# Altium footprint library 集大电协1.2.PcbLib: 175 footprints (part 5 of 11)
Each footprint in its own frame and in the unit in brackets; x right, y up, seen from the top. Pads: shape width x height; smd on the part's side, far side on the other; paste and mask are expansions set on the pad; w line width, h text height; cw(c..) or ccw(c..) is an arc to the next point about the centre after c.
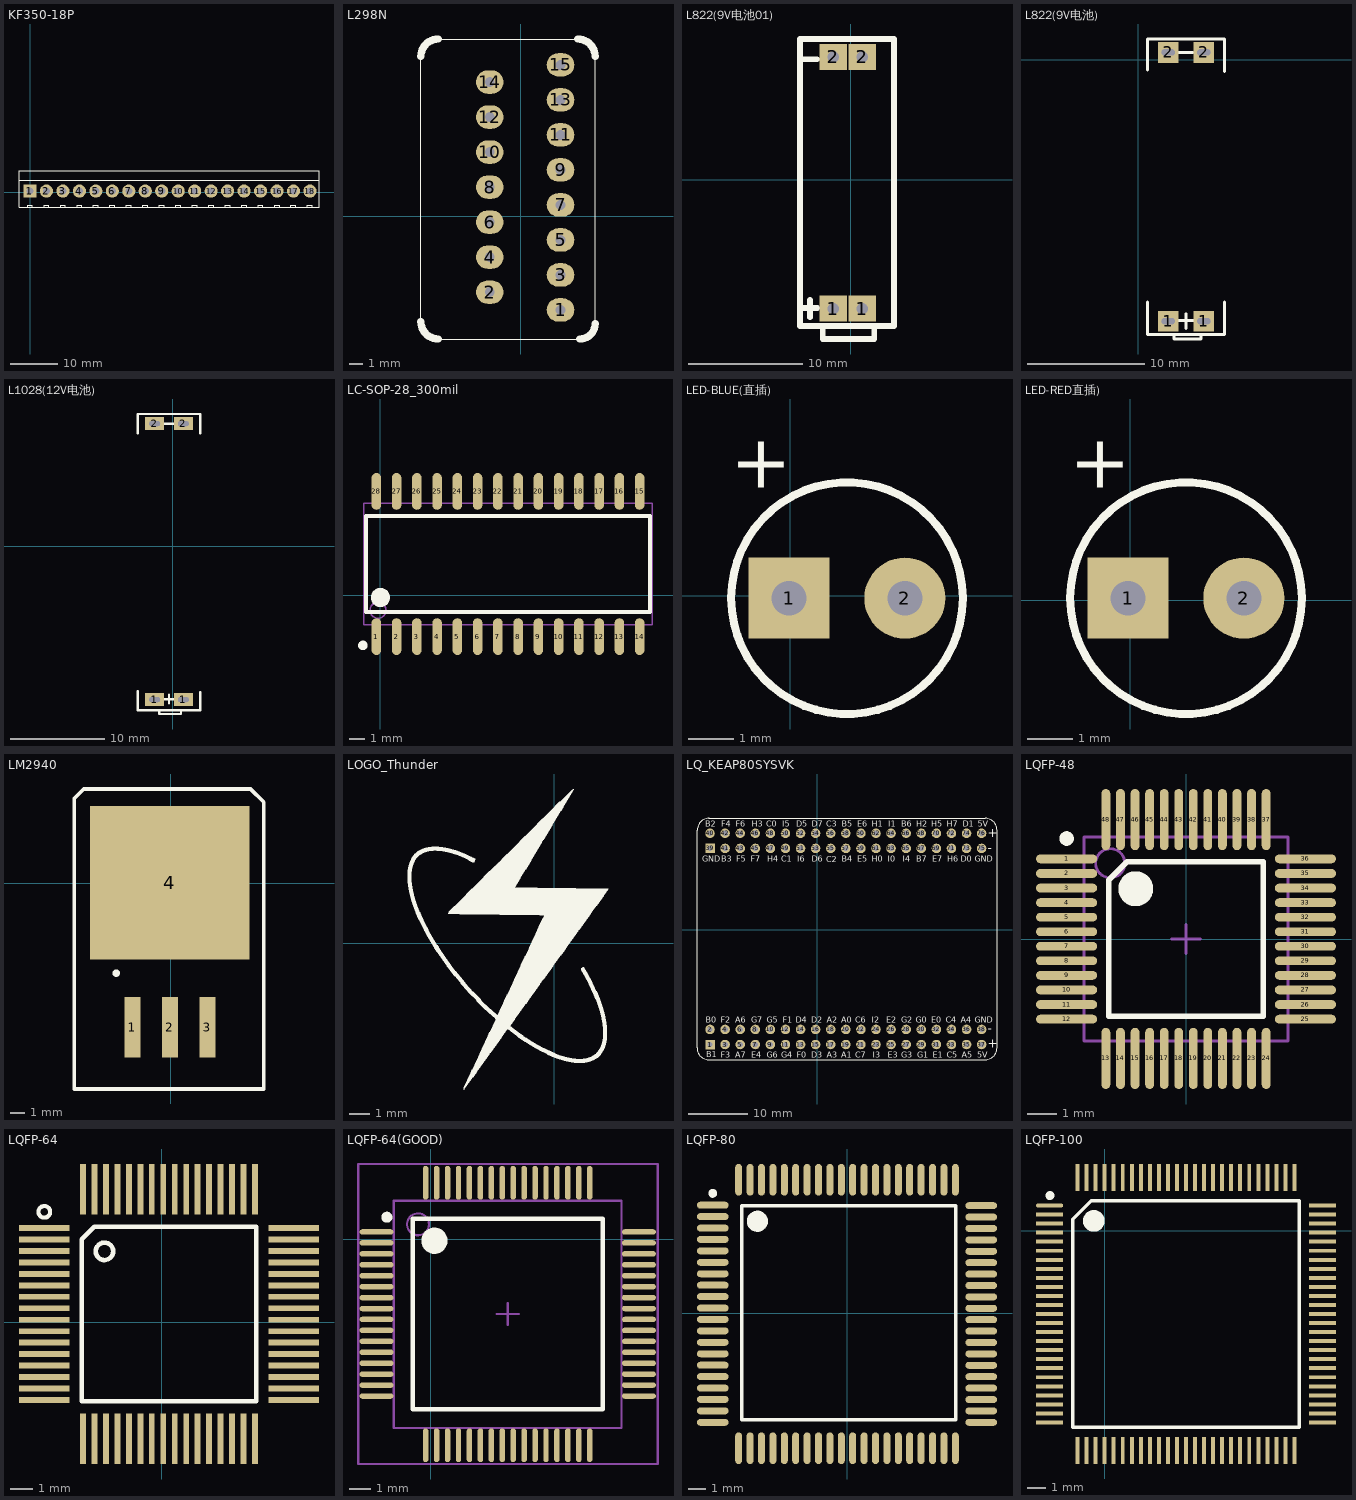
[diagram p4: the footprints below, top view; thin cyan lines are the x and y axes]

## KF350-18P [mil]
pads (18):
  rect 110x110 hole 59.06: 1(-1.14,8.5)
  round 110 hole 59.06: 2(136.65,8.5) 3(274.45,8.51) 4(412.25,8.51) 5(550.04,8.51) 6(687.84,8.51) 7(825.63,8.5) 8(963.43,8.5) 9(1101.22,8.5) 10(1239.02,8.5) 11(1376.81,8.5) 12(1514.61,8.5) 13(1652.4,8.5) 14(1790.2,8.5) 15(1927.99,8.5) 16(2065.99,8.5) 17(2203.74,8.5) 18(2341.54,8.5)
Top Overlay:
  lines w10: -93.14,100.5 1039.86,100.5 1176.14,100.5 ; -21.14,-128.5 -21.14,-111.5 18.86,-111.5 18.86,-128.5 ; 116.65,-128.5 116.65,-111.5 156.65,-111.5 156.65,-128.5 ; 254.45,-128.49 254.45,-111.5 294.45,-111.5 294.45,-128.49 ; 392.25,-128.49 392.25,-111.5 432.25,-111.5 432.25,-128.49 ; 530.04,-128.49 530.04,-111.5 570.04,-111.5 570.04,-128.49 ; 667.86,-128.5 667.86,-111.5 707.86,-111.5 707.86,-128.5 ; 805.86,-128.5 805.86,-111.5 845.86,-111.5 845.86,-128.5 ; 943.86,-128.5 943.86,-111.5 983.86,-111.5 983.86,-128.5 ; 1081.65,-128.5 1081.65,-111.5 1121.65,-111.5 1121.65,-128.5 ; 1177.65,100.5 1313.94,100.5 ; 1219.45,-128.5 1219.45,-111.5 1259.45,-111.5 1259.45,-128.5 ; 1315.45,100.5 1451.73,100.5 ; 1357.25,-128.5 1357.25,-111.5 1397.25,-111.5 1397.25,-128.5 ; 1453.25,100.5 1589.53,100.5 ; 1495.04,-128.5 1495.04,-111.5 1535.04,-111.5 1535.04,-128.5 ; 1591.04,100.5 1727.32,100.5 ; 1632.84,-128.5 1632.84,-111.5 1672.84,-111.5 1672.84,-128.5 ; 1728.84,100.5 1865.12,100.5 ; 1770.63,-128.5 1770.63,-111.5 1810.63,-111.5 1810.63,-128.5 ; 1866.63,100.5 2002.91,100.5 ; 1908.43,-128.5 1908.43,-111.5 1948.43,-111.5 1948.43,-128.5 ; 1996.63,100.5 2416.34,100.39 ; 2046.43,-128.5 2046.43,-111.5 ; 2047.43,-111.5 2087.43,-111.5 2087.43,-128.5 ; 2181.27,-126.53 2181.27,-109.53 ; 2182.27,-109.53 2222.27,-109.53 2222.27,-126.53 ; 2319.06,-127.51 2319.06,-110.51 ; 2320.06,-110.51 2360.06,-110.51 2360.06,-127.51 ; -93.14,-128.5 1039.86,-128.5 1177.65,-128.5 1315.45,-128.5 1453.25,-128.5 1591.04,-128.5 1728.84,-128.5 1866.63,-128.5 2417.32,-128.5 2417.32,180.5 1866.63,180.5 1728.84,180.5 1591.04,180.5 1453.25,180.5 1315.45,180.5 1177.65,180.5 1039.86,180.5 -93.14,180.5 -93.14,-128.5
3D body: height 393.7, standoff -149.61, extent -85.68,-123.13 67.86,172.14
3D body: height 393.7, standoff -149.61, extent 52.11,-123.13 205.65,172.14
3D body: height 393.7, standoff -149.61, extent 189.91,-123.13 343.45,172.14
3D body: height 393.7, standoff -149.61, extent 603.3,-123.13 756.84,172.14
3D body: height 393.7, standoff -149.61, extent 465.5,-123.13 619.04,172.14
3D body: height 393.7, standoff -149.61, extent 327.7,-123.13 481.24,172.14
3D body: height 393.7, standoff -149.61, extent 1016.68,-123.13 1170.22,172.14
3D body: height 393.7, standoff -149.61, extent 878.88,-123.14 1032.42,172.14
3D body: height 393.7, standoff -149.61, extent 741.08,-123.14 894.63,172.14
3D body: height 393.7, standoff -149.61, extent 1430.07,-123.13 1583.61,172.14
3D body: height 393.7, standoff -149.61, extent 1292.27,-123.14 1445.81,172.14
3D body: height 393.7, standoff -149.61, extent 1154.47,-123.14 1308.01,172.14
3D body: height 393.7, standoff -149.61, extent 1843.45,-123.13 1996.99,172.14
3D body: height 393.7, standoff -149.61, extent 1705.65,-123.14 1859.19,172.14
3D body: height 393.7, standoff -149.61, extent 1567.86,-123.14 1721.4,172.14
3D body: height 393.7, standoff -149.61, extent 1981.3,-123.14 2134.84,172.14
3D body: height 393.7, standoff -149.61, extent 2119.09,-123.03 2272.64,172.24
3D body: height 393.7, standoff -149.61, extent 2255.91,-123.14 2409.45,172.14

## L298N [mm]
pads (15):
  oval 2x1.7 hole 0.712: 1(2.87,-6.807) 2(-2.261,-5.512) 3(2.87,-4.267) 4(-2.261,-2.972) 5(2.87,-1.727) 6(-2.261,-0.432) 7(2.87,0.813) 8(-2.261,2.108) 9(2.87,3.353) 10(-2.261,4.648) 11(2.87,5.893) 12(-2.261,7.188) 13(2.87,8.433) 14(-2.261,9.728) 15(2.87,10.973)
Top Overlay:
  lines w0.076: -7.264,-7.645 -7.264,11.582 ; -5.994,-8.915 4.267,-8.915 ; -5.994,12.852 4.115,12.852 ; 5.385,-7.925 5.385,11.582
  lines w0.54: -7.264,-7.645 ccw(c-5.994,-7.645) -5.994,-8.915 ; -7.264,11.582 cw(c-5.994,11.582) -5.994,12.852 ; 4.115,12.852 cw(c4.115,11.582) 5.385,11.582 ; 4.267,-8.915 ccw(c4.267,-7.798) 5.385,-7.798
3D body "User Library-Multiwatt15V.STEP": height 21.3, standoff -1, extent -6.883,-7.666 3.007,11.934

## L822(9V电池01) [mil]
pads (4):
  rect 95x90 hole 40: 1(-60,-445) 1(40,-445) 2(-60,423) 2(40,423)
Top Overlay:
  lines w20: -165,-442.72 -115,-442.72 ; -165,415 -115.94,415 ; -140.63,-475 -140.63,-415 ; -95.94,-510.51 -95.94,-549.88 81.22,-549.88 81.22,-510.51 ; -175,-505 -175,-145.55 -175,485 150,485 150,-505 -175,-505

## L822(9V电池) [mil]
pads (4):
  rect 70x70 hole 20 slot 45 at 0 deg: 1(100,-880) 1(220,-880) 2(100,25) 2(220,25)
Top Overlay:
  lines w10: 30,-815 30,-925 290,-925 290,-815 ; 30,-35 30,70 290,70 290,-40 ; 120,-930 120,-940 210,-940 210,-930 ; 135,25 184.06,25 ; 135.63,-877.72 185.63,-877.72 ; 160,-905 160,-855

## L1028(12V电池) [mil]
pads (4):
  rect 80x55 hole 20 slot 45 at 0 deg: 1(-75,-640) 1(45,-640) 2(-75,510) 2(45,510)
Top Overlay:
  lines w10: -145,-605 -145,-685 115,-685 115,-610 ; -145,470 -145,550 115,550 115,470 ; -55,-690 -55,-700 35,-700 35,-690 ; -40,510 9.06,510 ; -39.37,-637.72 10.63,-637.72 ; -15,-655 -15,-620

## LC-SOP-28_300mil [mm]
pads (28):
  oval 0.6x2.3 smd: 1(-0.255,-2.575) 2(1.015,-2.575) 3(2.285,-2.575) 4(3.555,-2.575) 5(4.825,-2.575) 6(6.095,-2.575) 7(7.365,-2.575) 8(8.635,-2.575) 9(9.905,-2.575) 10(11.175,-2.575) 11(12.445,-2.575) 12(13.715,-2.575) 13(14.985,-2.575) 14(16.255,-2.575) 15(16.255,6.525) 16(14.985,6.525) 17(13.715,6.525) 18(12.445,6.525) 19(11.175,6.525) 20(9.905,6.525) 21(8.635,6.525) 22(7.365,6.525) 23(6.095,6.525) 24(4.825,6.525) 25(3.555,6.525) 26(2.285,6.525) 27(1.015,6.525) 28(-0.255,6.525)
Top Overlay:
  circle w0.3: c-1.1,-3.125 r0.15
  circle w0.6: c0,-0.125 r0.3
  lines w0.254: -0.9,-1.025 -0.9,4.975 16.9,4.975 16.9,-1.025 -0.9,-1.025
Mechanical 13:
  circle w0.1: c-0.15,-0.925 r0.5
  lines w0.1: -1.05,-1.825 -1.05,5.775 17.05,5.775 17.05,-1.825 -1.05,-1.825

## LED-BLUE(直插) [mil]
pads (2):
  rect 70x70 hole 30: 1(-0.98,-1.97)
  round 70 hole 30: 2(99.02,-1.97)
Top Overlay:
  circle w7: c49.02,-1.97 r100
  text "+" at 1.39,78.32 h78.74
3D body: height 204.72, standoff -78.74, extent -21.65,-79.72 116.93,77.76

## LED-RED直插) [mil]
pads (2):
  rect 70x70 hole 30: 1(-1.97,1.97)
  round 70 hole 30: 2(98.03,1.97)
Top Overlay:
  circle w7: c48.03,1.97 r100
  text "+" at 0.41,82.26 h78.74
3D body: height 204.72, standoff -78.74, extent -19.68,-76.76 118.9,80.71

## LM2940 [mm]
pads (4):
  rect 1.1x4.1 smd: 1(-2.591,-9.732) 2(-0.051,-9.732) 3(2.489,-9.732)
  rect 10.8x10.41 smd: 4(-0.051,0.047)
Top Overlay:
  circle w0.25: c-3.691,-6.076 r0.125
  lines w0.254: -6.528,-13.923 -6.528,5.762 -5.893,6.397 5.41,6.397 6.299,5.508 6.299,-13.923 -6.528,-13.923
3D body: height 5, standoff 0, extent -6.2,-5.2 6,6.2

## LOGO_Thunder [mm]
Top Overlay:
  drawing of 2284 lines, arcs and shapes, not listed

## LQ_KEAP80SYSVK [mm]
pads (76):
  rect 1.6x1.6 hole 0.9: 1(-18.016,-19.342) 39(-18.016,13.678)
  round 1.6 hole 0.9: 2(-18.016,-16.802) 3(-15.476,-19.342) 4(-15.476,-16.802) 5(-12.936,-19.342) 6(-12.936,-16.802) 7(-10.396,-19.342) 8(-10.396,-16.802) 9(-7.856,-19.342) 10(-7.856,-16.802) 11(-5.316,-19.342) 12(-5.316,-16.802) 13(-2.776,-19.342) 14(-2.776,-16.802) 15(-0.236,-19.342) 16(-0.236,-16.802) 17(2.304,-19.342) 18(2.304,-16.802) 19(4.844,-19.342) 20(4.844,-16.802) 21(7.384,-19.342) 22(7.384,-16.802) 23(9.924,-19.342) 24(9.924,-16.802) 25(12.464,-19.342) 26(12.464,-16.802) 27(15.004,-19.342) 28(15.004,-16.802) 29(17.544,-19.342) 30(17.544,-16.802) 31(20.084,-19.342) 32(20.084,-16.802) 33(22.624,-19.342) 34(22.624,-16.802) 35(25.164,-19.342) 36(25.164,-16.802) 37(27.704,-19.342) 38(27.704,-16.802) 40(-18.016,16.218) 41(-15.476,13.678) 42(-15.476,16.218) 43(-12.936,13.678) 44(-12.936,16.218) 45(-10.396,13.678) 46(-10.396,16.218) 47(-7.856,13.678) 48(-7.856,16.218) 49(-5.316,13.678) 50(-5.316,16.218) 51(-2.776,13.678) 52(-2.776,16.218) 53(-0.236,13.678) 54(-0.236,16.218) 55(2.304,13.678) 56(2.304,16.218) 57(4.844,13.678) 58(4.844,16.218) 59(7.384,13.678) 60(7.384,16.218) 61(9.924,13.678) 62(9.924,16.218) 63(12.464,13.678) 64(12.464,16.218) 65(15.004,13.678) 66(15.004,16.218) 67(17.544,13.678) 68(17.544,16.218) 69(20.084,13.678) 70(20.084,16.218) 71(22.624,13.678) 72(22.624,16.218) 73(25.164,13.678) 74(25.164,16.218) 75(27.704,13.678) 76(27.704,16.218)
Top Overlay:
  lines w0.2: -20.208,16.739 -20.208,-19.905 ccw(c-18.208,-19.905) -18.208,-21.905 28.292,-21.905 ccw(c28.292,-19.905) 30.292,-19.905 30.292,16.739 ccw(c28.292,16.739) 28.292,18.739 -18.208,18.739 ; -20.158,16.749 cw(c-18.158,16.749) -18.158,18.749
  text "-" at 28.752,13.039 h1.5
  text "+" at 28.742,-19.901 h1.5
  text "-" at 28.752,-17.401 h1.5
  text "+" at 28.762,15.579 h1.5
  text "C3" at 1.522,17.289 h1
  text "H2" at 16.702,17.289 h1
  text "5V" at 26.992,-21.561 h1
  text "A5" at 24.322,-21.561 h1
  text "C5" at 21.822,-21.561 h1
  text "E1" at 19.482,-21.551 h1
  text "G1" at 16.902,-21.561 h1
  text "G3" at 14.132,-21.561 h1
  text "E3" at 11.882,-21.551 h1
  text "I3" at 9.352,-21.561 h1
  text "C7" at 6.472,-21.561 h1
  text "A1" at 4.082,-21.561 h1
  text "A3" at 1.602,-21.561 h1
  text "D3" at -0.938,-21.561 h1
  text "F0" at -3.428,-21.561 h1
  text "G4" at -6.068,-21.561 h1
  text "G6" at -8.488,-21.561 h1
  text "E4" at -11.048,-21.561 h1
  text "A7" at -13.768,-21.561 h1
  text "F3" at -16.208,-21.561 h1
  text "GND" at 26.532,-15.641 h1
  text "A4" at 24.212,-15.641 h1
  text "C4" at 21.652,-15.641 h1
  text "E0" at 19.192,-15.641 h1
  text "G0" at 16.642,-15.641 h1
  text "G2" at 14.132,-15.641 h1
  text "E2" at 11.642,-15.641 h1
  text "I2" at 9.212,-15.641 h1
  text "C6" at 6.472,-15.641 h1
  text "A0" at 4.082,-15.641 h1
  text "A2" at 1.602,-15.641 h1
  text "D2" at -0.938,-15.641 h1
  text "D4" at -3.548,-15.641 h1
  text "F1" at -5.798,-15.641 h1
  text "G5" at -8.488,-15.641 h1
  text "G7" at -11.048,-15.641 h1
  text "A6" at -13.768,-15.641 h1
  text "F2" at -16.208,-15.641 h1
  text "B0" at -18.758,-15.641 h1
  text "GND" at 26.512,11.399 h1
  text "D0" at 24.192,11.399 h1
  text "H6" at 21.952,11.399 h1
  text "E7" at 19.392,11.389 h1
  text "B7" at 16.722,11.399 h1
  text "I4" at 14.442,11.389 h1
  text "I0" at 11.872,11.389 h1
  text "H0" at 9.222,11.399 h1
  text "E5" at 6.772,11.389 h1
  text "B4" at 4.162,11.399 h1
  text "C2" at 1.552,11.379 h1
  text "D6" at -0.858,11.399 h1
  text "I6" at -3.308,11.429 h1
  text "C1" at -5.988,11.399 h1
  text "H4" at -8.408,11.399 h1
  text "F7" at -11.138,11.389 h1
  text "F5" at -13.568,11.389 h1
  text "B3" at -16.128,11.399 h1
  text "GND" at -19.328,11.429 h1
  text "5V" at 27.052,17.289 h1
  text "D1" at 24.532,17.289 h1
  text "H7" at 21.872,17.289 h1
  text "H5" at 19.252,17.289 h1
  text "B6" at 14.192,17.289 h1
  text "I1" at 11.962,17.289 h1
  text "H1" at 9.232,17.289 h1
  text "E6" at 6.772,17.289 h1
  text "B5" at 4.142,17.289 h1
  text "D7" at -0.878,17.289 h1
  text "D5" at -3.488,17.289 h1
  text "I5" at -5.878,17.319 h1
  text "C0" at -8.568,17.289 h1
  text "H3" at -10.988,17.289 h1
  text "F6" at -13.708,17.289 h1
  text "F4" at -16.148,17.289 h1
  text "B2" at -18.788,17.289 h1
  text "B1" at -18.618,-21.521 h1

## LQFP-48 [mm]
pads (48):
  oval 2.1x0.3 smd: 1(-4.1,2.75) 2(-4.1,2.25) 3(-4.1,1.75) 4(-4.1,1.25) 5(-4.1,0.75) 6(-4.1,0.25) 7(-4.1,-0.25) 8(-4.1,-0.75) 9(-4.1,-1.25) 10(-4.1,-1.75) 11(-4.1,-2.25) 12(-4.1,-2.75) 25(4.1,-2.75) 26(4.1,-2.25) 27(4.1,-1.75) 28(4.1,-1.25) 29(4.1,-0.75) 30(4.1,-0.25) 31(4.1,0.25) 32(4.1,0.75) 33(4.1,1.25) 34(4.1,1.75) 35(4.1,2.25) 36(4.1,2.75)
  oval 0.3x2.1 smd: 13(-2.75,-4.1) 14(-2.25,-4.1) 15(-1.75,-4.1) 16(-1.25,-4.1) 17(-0.75,-4.1) 18(-0.25,-4.1) 19(0.25,-4.1) 20(0.75,-4.1) 21(1.25,-4.1) 22(1.75,-4.1) 23(2.25,-4.1) 24(2.75,-4.1) 37(2.75,4.1) 38(2.25,4.1) 39(1.75,4.1) 40(1.25,4.1) 41(0.75,4.1) 42(0.25,4.1) 43(-0.25,4.1) 44(-0.75,4.1) 45(-1.25,4.1) 46(-1.75,4.1) 47(-2.25,4.1) 48(-2.75,4.1)
Top Overlay:
  circle w0.6: c-1.725,1.725 r0.3
  circle w0.25: c-4.1,3.45 r0.125
  lines w0.2: -2.65,-2.65 -2.65,2.025 -2.025,2.65 2.65,2.65 2.65,-2.65 -2.65,-2.65
Mechanical 13:
  circle w0.1: c-2.6,2.6 r0.5
  lines w0.1: -3.5,-3.5 3.5,-3.5 3.5,3.5 -3.5,3.5 -3.5,-3.5
Mechanical 15:
  lines w0.1: -0.5,0 0.5,0 ; 0,-0.5 0,0.5
3D body: height 1.5, standoff 0, extent -4.5,-4.5 4.5,4.5

## LQFP-64 [mil]
pads (64):
  rect 86.61x10 smd: 1(-202,162) 2(-202,142.31) 3(-202,122.63) 4(-202,102.94) 5(-202,83.26) 6(-202,63.58) 7(-202,43.89) 8(-202,24.21) 9(-202,4.52) 10(-202,-15.17) 11(-202,-34.85) 12(-202,-54.54) 13(-202,-74.22) 14(-202,-93.91) 15(-202,-113.59) 16(-202,-133.27) 33(227.13,-133.27) 34(227.13,-113.59) 35(227.13,-93.9) 36(227.13,-74.22) 37(227.13,-54.54) 38(227.13,-34.85) 39(227.13,-15.17) 40(227.13,4.52) 41(227.13,24.21) 42(227.13,43.89) 43(227.13,63.58) 44(227.13,83.26) 45(227.13,102.95) 46(227.13,122.63) 47(227.13,142.31) 48(227.13,162)
  rect 10x86.61 smd: 17(-135.07,-200.2) 18(-115.39,-200.2) 19(-95.7,-200.21) 20(-76.02,-200.2) 21(-56.33,-200.2) 22(-36.65,-200.2) 23(-16.96,-200.21) 24(2.72,-200.2) 25(22.41,-200.2) 26(42.09,-200.21) 27(61.78,-200.2) 28(81.46,-200.2) 29(101.15,-200.21) 30(120.83,-200.2) 31(140.52,-200.2) 32(160.21,-200.2) 49(160.2,228.93) 50(140.52,228.93) 51(120.83,228.93) 52(101.15,228.93) 53(81.46,228.93) 54(61.78,228.93) 55(42.09,228.93) 56(22.41,228.93) 57(2.72,228.93) 58(-16.96,228.93) 59(-36.65,228.93) 60(-56.33,228.93) 61(-76.02,228.93) 62(-95.7,228.93) 63(-115.39,228.93) 64(-135.07,228.93)
Top Overlay:
  circle w7: c-201.77,189.96 r10
  circle w7.87: c-98.43,122.05 r15
  lines w7.87: -137.63,-135.83 -137.63,142.88 -115.95,164.56 162.76,164.56 162.76,-135.83 -137.63,-135.83
3D body: height 63.78, standoff -0.28, extent -226.24,-225.4 251.84,252.68

## LQFP-64(GOOD) [mm]
pads (64):
  oval 1.55x0.25 smd: 1(-2.486,0.325) 2(-2.486,-0.175) 3(-2.486,-0.676) 4(-2.486,-1.175) 5(-2.486,-1.675) 6(-2.486,-2.175) 7(-2.486,-2.675) 8(-2.486,-3.176) 9(-2.486,-3.675) 10(-2.486,-4.175) 11(-2.486,-4.675) 12(-2.486,-5.175) 13(-2.486,-5.676) 14(-2.486,-6.175) 15(-2.486,-6.675) 16(-2.486,-7.175) 33(9.514,-7.175) 34(9.514,-6.675) 35(9.514,-6.175) 36(9.514,-5.676) 37(9.514,-5.175) 38(9.514,-4.675) 39(9.514,-4.175) 40(9.514,-3.675) 41(9.514,-3.176) 42(9.514,-2.675) 43(9.514,-2.175) 44(9.514,-1.675) 45(9.514,-1.175) 46(9.514,-0.676) 47(9.514,-0.175) 48(9.514,0.325)
  oval 0.25x1.55 smd: 17(-0.236,-9.426) 18(0.263,-9.426) 19(0.764,-9.426) 20(1.264,-9.426) 21(1.763,-9.426) 22(2.264,-9.426) 23(2.763,-9.426) 24(3.264,-9.426) 25(3.764,-9.426) 26(4.263,-9.426) 27(4.764,-9.426) 28(5.263,-9.426) 29(5.764,-9.426) 30(6.264,-9.426) 31(6.763,-9.426) 32(7.264,-9.426) 49(7.264,2.575) 50(6.763,2.575) 51(6.264,2.575) 52(5.764,2.575) 53(5.263,2.575) 54(4.764,2.575) 55(4.263,2.575) 56(3.764,2.575) 57(3.264,2.575) 58(2.763,2.575) 59(2.264,2.575) 60(1.763,2.575) 61(1.264,2.575) 62(0.764,2.575) 63(0.263,2.575) 64(-0.236,2.575)
Top Overlay:
  circle w0.25: c-2.011,1 r0.125
  circle w0.6: c0.163,-0.075 r0.3
  lines w0.2: -0.837,-7.775 -0.837,0.925 7.863,0.925 7.863,-7.775 -0.837,-7.775
Mechanical 13:
  circle w0.1: c-0.586,0.674 r0.5
  lines w0.1: -1.693,-8.632 -1.693,1.756 8.721,1.756 8.721,-8.632 -1.693,-8.632
Mechanical 15:
  lines w0.1: 3.013,-3.425 4.013,-3.425 ; 3.514,-3.925 3.514,-2.925 ; -3.319,-10.283 -3.319,3.433 10.372,3.433 10.372,-10.283 -3.319,-10.283
3D body: height 1.2, standoff 0, extent -1.693,-8.632 8.721,1.782
3D body: height 0.3, standoff 0, extent 7.137,2.003 7.391,3.146
3D body: height 0.3, standoff 0, extent 6.646,2.003 6.9,3.146
3D body: height 0.3, standoff 0, extent 6.146,2.003 6.4,3.146
3D body: height 0.3, standoff 0, extent 5.646,2.003 5.9,3.146
3D body: height 0.3, standoff 0, extent 5.146,2.003 5.4,3.146
3D body: height 0.3, standoff 0, extent 4.646,2.003 4.9,3.146
3D body: height 0.3, standoff 0, extent 4.146,2.003 4.4,3.146
3D body: height 0.3, standoff 0, extent 3.646,2.003 3.9,3.146
3D body: height 0.3, standoff 0, extent 3.146,2.003 3.4,3.146
3D body: height 0.3, standoff 0, extent 2.646,2.003 2.9,3.146
3D body: height 0.3, standoff 0, extent 2.146,2.003 2.4,3.146
3D body: height 0.3, standoff 0, extent 1.646,2.003 1.9,3.146
3D body: height 0.3, standoff 0, extent 1.146,2.003 1.4,3.146
3D body: height 0.3, standoff 0, extent 0.646,2.003 0.9,3.146
3D body: height 0.3, standoff 0, extent 0.146,2.003 0.4,3.146
3D body: height 0.3, standoff 0, extent -0.354,2.003 -0.1,3.146
3D body: height 0.3, standoff 0, extent -3.04,-7.312 -1.897,-7.058
3D body: height 0.3, standoff 0, extent -3.04,-6.812 -1.897,-6.558
3D body: height 0.3, standoff 0, extent -3.04,-6.312 -1.897,-6.058
3D body: height 0.3, standoff 0, extent -3.04,-5.812 -1.897,-5.558
3D body: height 0.3, standoff 0, extent -3.04,-5.312 -1.897,-5.058
3D body: height 0.3, standoff 0, extent -3.04,-4.812 -1.897,-4.558
3D body: height 0.3, standoff 0, extent -3.04,-4.312 -1.897,-4.058
3D body: height 0.3, standoff 0, extent -3.04,-3.812 -1.897,-3.558
3D body: height 0.3, standoff 0, extent -3.04,-3.312 -1.897,-3.058
3D body: height 0.3, standoff 0, extent -3.04,-2.812 -1.897,-2.558
3D body: height 0.3, standoff 0, extent -3.04,-2.312 -1.897,-2.058
3D body: height 0.3, standoff 0, extent -3.04,-1.812 -1.897,-1.558
3D body: height 0.3, standoff 0, extent -3.04,-1.312 -1.897,-1.058
3D body: height 0.3, standoff 0, extent -3.04,-0.812 -1.897,-0.558
3D body: height 0.3, standoff 0, extent -3.04,-0.312 -1.897,-0.058
3D body: height 0.3, standoff 0, extent -3.04,0.198 -1.897,0.452
3D body: height 0.3, standoff 0, extent 8.942,-7.302 10.085,-7.048
3D body: height 0.3, standoff 0, extent 8.942,-6.812 10.085,-6.558
3D body: height 0.3, standoff 0, extent 8.942,-6.312 10.085,-6.058
3D body: height 0.3, standoff 0, extent 8.942,-5.812 10.085,-5.558
3D body: height 0.3, standoff 0, extent 8.942,-5.312 10.085,-5.058
3D body: height 0.3, standoff 0, extent 8.942,-4.812 10.085,-4.558
3D body: height 0.3, standoff 0, extent 8.942,-4.312 10.085,-4.058
3D body: height 0.3, standoff 0, extent 8.942,-3.812 10.085,-3.558
3D body: height 0.3, standoff 0, extent 8.942,-3.312 10.085,-3.058
3D body: height 0.3, standoff 0, extent 8.942,-2.812 10.085,-2.558
3D body: height 0.3, standoff 0, extent 8.942,-2.312 10.085,-2.058
3D body: height 0.3, standoff 0, extent 8.942,-1.812 10.085,-1.558
3D body: height 0.3, standoff 0, extent 8.942,-1.312 10.085,-1.058
3D body: height 0.3, standoff 0, extent 8.942,-0.812 10.085,-0.558
3D body: height 0.3, standoff 0, extent 8.942,-0.312 10.085,-0.058
3D body: height 0.3, standoff 0, extent 8.942,0.198 10.085,0.452
3D body: height 0.3, standoff 0, extent 7.162,-9.966 7.416,-8.823
3D body: height 0.3, standoff 0, extent 6.662,-9.966 6.916,-8.823
3D body: height 0.3, standoff 0, extent 6.162,-9.966 6.416,-8.823
3D body: height 0.3, standoff 0, extent 5.662,-9.966 5.916,-8.823
3D body: height 0.3, standoff 0, extent 5.162,-9.966 5.416,-8.823
3D body: height 0.3, standoff 0, extent 4.662,-9.966 4.916,-8.823
3D body: height 0.3, standoff 0, extent 4.162,-9.966 4.416,-8.823
3D body: height 0.3, standoff 0, extent 3.662,-9.966 3.916,-8.823
3D body: height 0.3, standoff 0, extent 3.162,-9.966 3.416,-8.823
3D body: height 0.3, standoff 0, extent 2.662,-9.966 2.916,-8.823
3D body: height 0.3, standoff 0, extent 2.162,-9.966 2.416,-8.823
3D body: height 0.3, standoff 0, extent 1.662,-9.966 1.916,-8.823
3D body: height 0.3, standoff 0, extent 1.162,-9.966 1.416,-8.823
3D body: height 0.3, standoff 0, extent 0.662,-9.966 0.916,-8.823
3D body: height 0.3, standoff 0, extent 0.162,-9.966 0.416,-8.823
3D body: height 0.3, standoff 0, extent -0.338,-9.966 -0.084,-8.823
3D body: height 1.21, standoff 0, extent -0.596,0.287 -0.198,0.686

## LQFP-80 [mm]
pads (80):
  oval 1.8x0.4 smd: 1(-7.66,6.149) 2(-7.66,5.497) 3(-7.66,4.846) 4(-7.66,4.195) 5(-7.66,3.543) 6(-7.66,2.892) 7(-7.66,2.24) 8(-7.66,1.589) 9(-7.66,0.937) 10(-7.66,0.286) 11(-7.66,-0.365) 12(-7.66,-1.017) 13(-7.66,-1.668) 14(-7.66,-2.32) 15(-7.66,-2.971) 16(-7.66,-3.623) 17(-7.66,-4.274) 18(-7.66,-4.925) 19(-7.66,-5.577) 20(-7.66,-6.228) 41(7.64,-6.228) 42(7.64,-5.578) 43(7.64,-4.928) 44(7.64,-4.278) 45(7.64,-3.628) 46(7.64,-2.978) 47(7.64,-2.328) 48(7.64,-1.678) 49(7.64,-1.028) 50(7.64,-0.378) 51(7.64,0.272) 52(7.64,0.922) 53(7.64,1.572) 54(7.64,2.222) 55(7.64,2.872) 56(7.64,3.522) 57(7.64,4.172) 58(7.64,4.822) 59(7.64,5.472) 60(7.64,6.122)
  oval 0.4x1.8 smd: 21(-6.185,-7.703) 22(-5.535,-7.703) 23(-4.885,-7.703) 24(-4.235,-7.703) 25(-3.585,-7.703) 26(-2.935,-7.703) 27(-2.285,-7.703) 28(-1.635,-7.703) 29(-0.985,-7.703) 30(-0.335,-7.703) 31(0.315,-7.703) 32(0.965,-7.703) 33(1.615,-7.703) 34(2.265,-7.703) 35(2.915,-7.703) 36(3.565,-7.703) 37(4.215,-7.703) 38(4.865,-7.703) 39(5.515,-7.703) 40(6.165,-7.703) 61(6.165,7.597) 62(5.515,7.597) 63(4.865,7.597) 64(4.215,7.597) 65(3.565,7.597) 66(2.915,7.597) 67(2.265,7.597) 68(1.615,7.597) 69(0.965,7.597) 70(0.315,7.597) 71(-0.335,7.597) 72(-0.985,7.597) 73(-1.635,7.597) 74(-2.285,7.597) 75(-2.935,7.597) 76(-3.585,7.597) 77(-4.235,7.597) 78(-4.885,7.597) 79(-5.535,7.597) 80(-6.185,7.597)
Top Overlay:
  circle w0.25: c-7.66,6.822 r0.125
  circle w0.6: c-5.12,5.233 r0.3
  lines w0.2: -6.009,-6.07 -6.009,6.122 6.183,6.122 6.183,-6.07 -6.009,-6.07
3D body: height 1.75, standoff 0, extent -8.031,-8.084 8.006,7.952

## LQFP-100 [mm]
pads (100):
  oval 1.5x0.22 smd: 1(-3.048,1.397)
  rect 1.5x0.22 smd: 2(-3.048,0.897) 3(-3.048,0.397) 4(-3.048,-0.103) 5(-3.048,-0.603) 6(-3.048,-1.103) 7(-3.048,-1.603) 8(-3.048,-2.103) 9(-3.048,-2.603) 10(-3.048,-3.103) 11(-3.048,-3.603) 12(-3.048,-4.103) 13(-3.048,-4.603) 14(-3.048,-5.103) 15(-3.048,-5.603) 16(-3.048,-6.103) 17(-3.048,-6.603) 18(-3.048,-7.103) 19(-3.048,-7.603) 20(-3.048,-8.103) 21(-3.048,-8.603) 22(-3.048,-9.103) 23(-3.048,-9.603) 24(-3.048,-10.103) 25(-3.048,-10.603) 51(12.05,-10.603) 52(12.05,-10.103) 53(12.05,-9.603) 54(12.05,-9.103) 55(12.05,-8.603) 56(12.05,-8.103) 57(12.05,-7.603) 58(12.05,-7.103) 59(12.05,-6.603) 60(12.05,-6.103) 61(12.05,-5.603) 62(12.05,-5.103) 63(12.05,-4.603) 64(12.05,-4.103) 65(12.05,-3.603) 66(12.05,-3.103) 67(12.05,-2.603) 68(12.05,-2.103) 69(12.05,-1.603) 70(12.05,-1.103) 71(12.05,-0.603) 72(12.05,-0.103) 73(12.05,0.397) 74(12.05,0.897) 75(12.05,1.397)
  rect 0.22x1.5 smd: 26(-1.499,-12.152) 27(-0.999,-12.152) 28(-0.499,-12.152) 29(0.001,-12.152) 30(0.501,-12.152) 31(1.001,-12.152) 32(1.501,-12.152) 33(2.001,-12.152) 34(2.501,-12.152) 35(3.001,-12.152) 36(3.501,-12.152) 37(4.001,-12.152) 38(4.501,-12.152) 39(5.001,-12.152) 40(5.501,-12.152) 41(6.001,-12.152) 42(6.501,-12.152) 43(7.001,-12.152) 44(7.501,-12.152) 45(8.001,-12.152) 46(8.501,-12.152) 47(9.001,-12.152) 48(9.501,-12.152) 49(10.001,-12.152) 50(10.501,-12.152) 76(10.501,2.946) 77(10.001,2.946) 78(9.501,2.946) 79(9.001,2.946) 80(8.501,2.946) 81(8.001,2.946) 82(7.501,2.946) 83(7.001,2.946) 84(6.501,2.946) 85(6.001,2.946) 86(5.501,2.946) 87(5.001,2.946) 88(4.501,2.946) 89(4.001,2.946) 90(3.501,2.946) 91(3.001,2.946) 92(2.501,2.946) 93(2.001,2.946) 94(1.501,2.946) 95(1.001,2.946) 96(0.501,2.946) 97(0.001,2.946) 98(-0.499,2.946) 99(-0.999,2.946) 100(-1.499,2.946)
Top Overlay:
  circle w0.6: c-0.6,0.55 r0.3
  circle w0.25: c-3.025,1.95 r0.125
  lines w0.2: -1.763,-10.867 -1.763,0.637 -0.739,1.661 10.765,1.661 10.765,-10.867 -1.763,-10.867
3D body: height 1.62, standoff -0.01, extent -3.572,-12.675 12.572,3.468